# Altium footprint library Connectors.PcbLib: 20 footprints (part 2 of 2)
Each footprint in its own frame and in the unit in brackets; x right, y up, seen from the top. Pads: shape width x height; smd on the part's side, far side on the other; paste and mask are expansions set on the pad; w line width, h text height; cw(c..) or ccw(c..) is an arc to the next point about the centre after c.
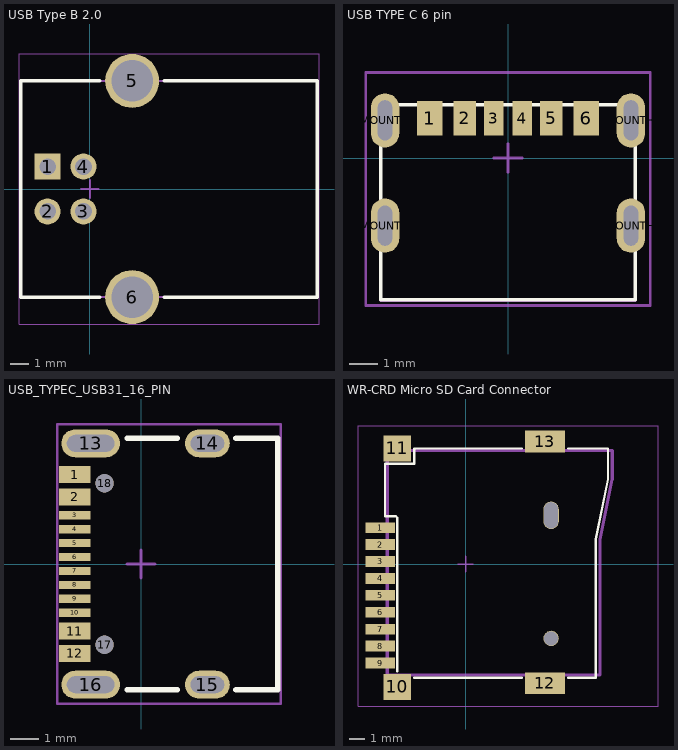
[diagram p1: the footprints below, top view; thin cyan lines are the x and y axes]

## USB Type B 2.0 [mm] "USB Connector, 4-Leads, Body 16.5x12.04mm"
height 10.9
pads (6):
  rect 1.45x1.45 hole 0.92 mask+0.05: 1(-2.355,1.25)
  round 1.45 hole 0.92 mask+0.05: 2(-2.355,-1.25) 3(-0.355,-1.25) 4(-0.355,1.25)
  round 3 hole 2.3 mask+0.05: 5(2.355,6.02) 6(2.355,-6.02)
Top Overlay:
  lines w0.2: 0.555,-6.02 -3.845,-6.02 -3.845,6.02 0.555,6.02 ; 4.155,-6.02 12.655,-6.02 12.655,6.02 4.155,6.02
Top Assembly:
  lines w0.1: -3.845,-6.02 12.655,-6.02 12.655,6.02 -3.845,6.02 -3.845,-6.02
Top Courtyard:
  lines w0.05: -3.945,-7.52 12.755,-7.52 12.755,7.52 -3.945,7.52 -3.945,-7.52
Top Component Center:
  lines w0.1: -0.5,0 0.5,0 ; 0,-0.5 0,0.5
3D body "USB 2.0 Type B Connector Right Angle (Würth 61400416121).stp": height 10.97, standoff -3.41, extent -3.68,-7.422 12.82,7.422

## USB TYPE C 6 pin [mm]
pads (10):
  rect 0.9x1.2 smd mask+0.05: 1(-2.75,1.4) 6(2.75,1.4)
  rect 0.8x1.2 smd mask+0.05: 2(-1.52,1.4) 5(1.52,1.4)
  rect 0.7x1.2 smd mask+0.05: 3(-0.5,1.4) 4(0.5,1.4)
  oval 1x1.9 hole 0.5 slot 1.4 at 90 deg mask+0.05: MOUNTH(-4.32,-2.375) MOUNTH(-4.32,1.325) MOUNTH(4.32,-2.375) MOUNTH(4.32,1.325)
Top Overlay:
  lines w0.12: -4.47,-4.975 -4.47,1.875 4.47,1.875 4.47,-4.975 -4.47,-4.975
Top Assembly:
  lines w0.1: -4.475,-5 -4.475,1.875 4.475,1.875 4.475,-5 -4.475,-5
Top Courtyard:
  lines w0.1: -5,-5.175 5,-5.175 5,3 -5,3 -5,-5.175
Top Component Center:
  lines w0.1: -0.5,0 0.5,0 ; 0,-0.5 0,0.5
3D body "USB Connector Type C female 6pin.STEP": height 3.4, standoff -0.82, extent -4.47,-5 4.47,1.87

## USB_TYPEC_USB31_16_PIN [mm]
pads (18):
  rect 1.14x0.6 smd mask+0.05: 1(-2.375,3.2) 2(-2.375,2.4) 11(-2.375,-2.4) 12(-2.375,-3.2)
  rect 1.14x0.3 smd mask+0.05: 3(-2.375,1.75) 4(-2.375,1.25) 5(-2.375,0.75) 6(-2.375,0.25) 7(-2.375,-0.25) 8(-2.375,-0.75) 9(-2.375,-1.25) 10(-2.375,-1.75)
  oval 2.1x1 hole 0.6 slot 1.7 at 0 deg mask+0.05: 13(-1.805,4.32) 16(-1.805,-4.32)
  oval 1.6x1 hole 0.6 slot 1.2 at 0 deg mask+0.05: 14(2.375,4.32) 15(2.375,-4.32)
  round 0.65 hole 0.65 unplated mask+0: 17(-1.305,-2.89) 18(-1.305,2.89)
Top Overlay:
  lines w0.2: -0.5,-4.5 1.3,-4.5 ; -0.5,4.5 1.3,4.5 ; 3.4,-4.5 4.9,-4.5 4.9,4.5 3.4,4.5
Top Courtyard:
  lines w0.1: -3,-5 -3,5 5,5 5,-5 -3,-5
Top Component Center:
  lines w0.1: -0.5,0 0.5,0 ; 0,-0.5 0,0.5
3D body "Type-C 16P.STEP": height 3.21, standoff -1, extent -2.95,-4.47 4.95,4.47

## WR-CRD Micro SD Card Connector [mm] "WR-CRD Micro SD Card Connector"
pads (15):
  rect 1.9x0.7 smd mask+0.05: 1(-5.55,2.375) 2(-5.55,1.275) 3(-5.55,0.175) 4(-5.55,-0.925) 5(-5.55,-2.025) 6(-5.55,-3.125) 7(-5.55,-4.225) 8(-5.55,-5.325) 9(-5.55,-6.425)
  rect 1.8x1.7 smd mask+0.05: 10(-4.45,-7.975) 11(-4.45,7.525)
  rect 2.6x1.4 smd mask+0.05: 12(5.15,-7.725) 13(5.15,7.975)
  oval 1x1.8 hole 0.9 slot 1.7 at 90 deg mask+0.05: POS_HOLE(5.55,3.175)
  round 1 hole 0.9 mask+0.05: POS_HOLE(5.55,-4.825)
Top Overlay:
  lines w0.15: -4.45,-6.975 -4.45,3.025 -4.55,3.125 -5.25,3.125 -5.25,6.525 -3.35,6.525 -3.35,7.525 3.65,7.525 ; -3.35,-7.375 3.65,-7.375 ; 6.65,-7.375 8.45,-7.375 8.45,1.625 9.25,5.525 9.25,7.525 6.65,7.525
Top Assembly:
  lines w0.2: -5.1,-7.2 8.725,-7.2 8.725,1.6 9.525,5.5 9.525,7.4 -3.2,7.4 -5.1,7.4 -5.1,3.3 -5.1,-7.2
Top Courtyard:
  lines w0.05: -7,-9.25 12.5,-9.25 12.5,9 -7,9 -7,8.75 -7,-9.25
Top Component Center:
  lines w0.1: -0.5,0 0.5,0 ; 0,-0.5 0,0.5
3D body "TF-01A.step": height 2.05, standoff -0.35, extent -5.7,-7.85 12.121,8.25